# Altium footprint library ST封装.PcbLib: 1336 footprints (part 73 of 109)
Each footprint in its own frame and in the unit in brackets; x right, y up, seen from the top. Pads: shape width x height; smd on the part's side, far side on the other; paste and mask are expansions set on the pad; w line width, h text height; cw(c..) or ccw(c..) is an arc to the next point about the centre after c.
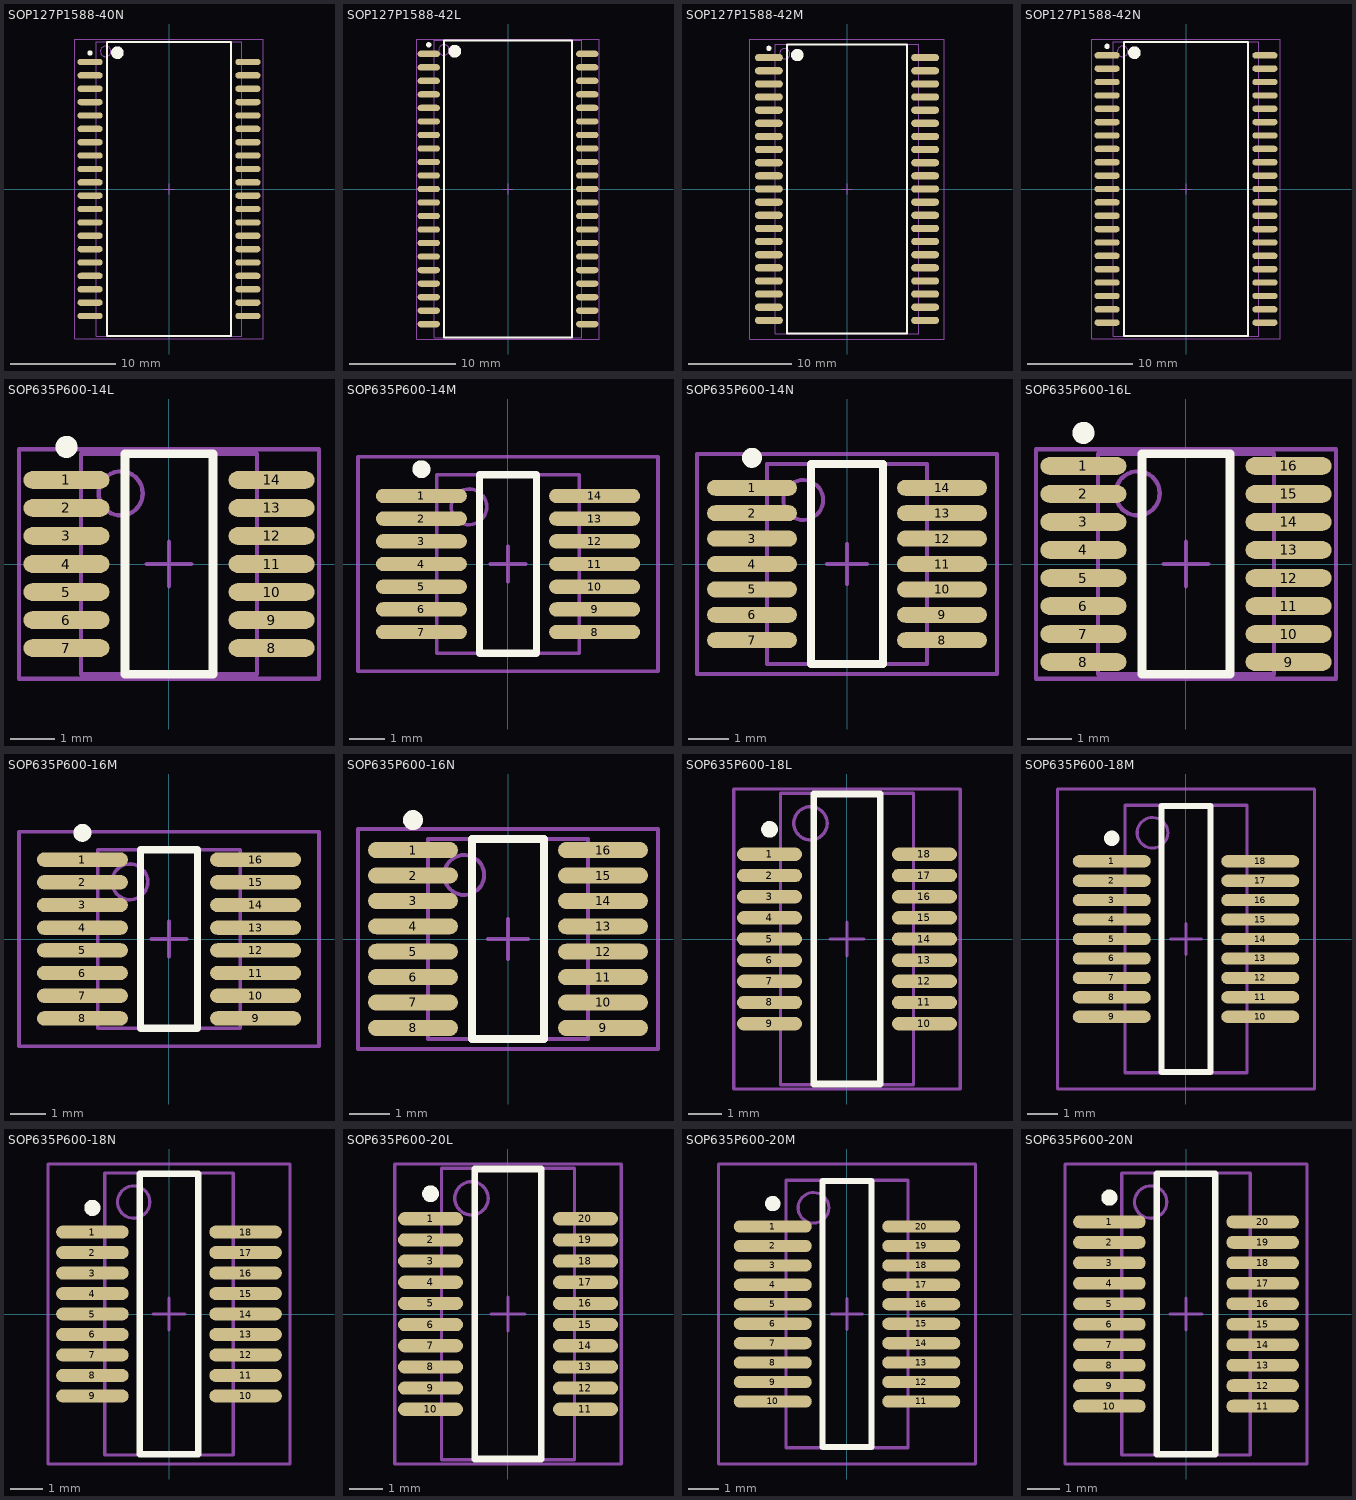
[diagram p72: the footprints below, top view; thin cyan lines are the x and y axes]

## SOP127P1588-40N [mm] "SOP, 40-Leads, Body 27x13.8mm, Pitch 1.27mm, IPC Medium Density"
height 4
pads (40):
  oval 2.4x0.6 smd: 1(-7.5,12.065) 2(-7.5,10.795) 3(-7.5,9.525) 4(-7.5,8.255) 5(-7.5,6.985) 6(-7.5,5.715) 7(-7.5,4.445) 8(-7.5,3.175) 9(-7.5,1.905) 10(-7.5,0.635) 11(-7.5,-0.635) 12(-7.5,-1.905) 13(-7.5,-3.175) 14(-7.5,-4.445) 15(-7.5,-5.715) 16(-7.5,-6.985) 17(-7.5,-8.255) 18(-7.5,-9.525) 19(-7.5,-10.795) 20(-7.5,-12.065) 21(7.5,-12.065) 22(7.5,-10.795) 23(7.5,-9.525) 24(7.5,-8.255) 25(7.5,-6.985) 26(7.5,-5.715) 27(7.5,-4.445) 28(7.5,-3.175) 29(7.5,-1.905) 30(7.5,-0.635) 31(7.5,0.635) 32(7.5,1.905) 33(7.5,3.175) 34(7.5,4.445) 35(7.5,5.715) 36(7.5,6.985) 37(7.5,8.255) 38(7.5,9.525) 39(7.5,10.795) 40(7.5,12.065)
Top Overlay:
  circle w0.6: c-4.9,12.95 r0.3
  circle w0.25: c-7.5,12.915 r0.125
  lines w0.2: -5.9,-13.95 5.9,-13.95 5.9,13.95 -5.9,13.95 -5.9,-13.95
Mechanical 13:
  circle w0.1: c-6.02,13.07 r0.5
  lines w0.1: -6.92,-13.97 6.92,-13.97 6.92,13.97 -6.92,13.97 -6.92,-13.97
Mechanical 15:
  lines w0.1: -0.5,0 0.5,0 ; 0,-0.5 0,0.5 ; -8.95,-14.25 8.95,-14.25 8.95,14.25 -8.95,14.25 -8.95,-14.25
3D body: height 4, standoff 0, extent -6.92,-13.97 6.92,13.97

## SOP127P1588-42L [mm] "SOP, 42-Leads, Body 27x13.8mm, Pitch 1.27mm, IPC High Density"
height 4
pads (42):
  oval 2.1x0.6 smd: 1(-7.45,12.7) 2(-7.45,11.43) 3(-7.45,10.16) 4(-7.45,8.89) 5(-7.45,7.62) 6(-7.45,6.35) 7(-7.45,5.08) 8(-7.45,3.81) 9(-7.45,2.54) 10(-7.45,1.27) 11(-7.45,0) 12(-7.45,-1.27) 13(-7.45,-2.54) 14(-7.45,-3.81) 15(-7.45,-5.08) 16(-7.45,-6.35) 17(-7.45,-7.62) 18(-7.45,-8.89) 19(-7.45,-10.16) 20(-7.45,-11.43) 21(-7.45,-12.7) 22(7.45,-12.7) 23(7.45,-11.43) 24(7.45,-10.16) 25(7.45,-8.89) 26(7.45,-7.62) 27(7.45,-6.35) 28(7.45,-5.08) 29(7.45,-3.81) 30(7.45,-2.54) 31(7.45,-1.27) 32(7.45,0) 33(7.45,1.27) 34(7.45,2.54) 35(7.45,3.81) 36(7.45,5.08) 37(7.45,6.35) 38(7.45,7.62) 39(7.45,8.89) 40(7.45,10.16) 41(7.45,11.43) 42(7.45,12.7)
Top Overlay:
  circle w0.25: c-7.45,13.55 r0.125
  circle w0.6: c-5,12.95 r0.3
  lines w0.2: -6,-13.95 -6,13.95 6,13.95 6,-13.95 -6,-13.95
Mechanical 13:
  circle w0.1: c-6.02,13.07 r0.5
  lines w0.1: -6.92,-13.97 -6.92,13.97 6.92,13.97 6.92,-13.97 -6.92,-13.97
Mechanical 15:
  lines w0.1: -0.5,0 0.5,0 ; 0,-0.5 0,0.5 ; -8.6,-14.1 -8.6,14.1 8.6,14.1 8.6,-14.1 -8.6,-14.1
3D body: height 4, standoff 0, extent -6.92,-13.97 6.92,13.97

## SOP127P1588-42M [mm] "SOP, 42-Leads, Body 27x13.8mm, Pitch 1.27mm, IPC Low Density"
height 4
pads (42):
  oval 2.7x0.7 smd: 1(-7.55,12.7) 2(-7.55,11.43) 3(-7.55,10.16) 4(-7.55,8.89) 5(-7.55,7.62) 6(-7.55,6.35) 7(-7.55,5.08) 8(-7.55,3.81) 9(-7.55,2.54) 10(-7.55,1.27) 11(-7.55,0) 12(-7.55,-1.27) 13(-7.55,-2.54) 14(-7.55,-3.81) 15(-7.55,-5.08) 16(-7.55,-6.35) 17(-7.55,-7.62) 18(-7.55,-8.89) 19(-7.55,-10.16) 20(-7.55,-11.43) 21(-7.55,-12.7) 22(7.55,-12.7) 23(7.55,-11.43) 24(7.55,-10.16) 25(7.55,-8.89) 26(7.55,-7.62) 27(7.55,-6.35) 28(7.55,-5.08) 29(7.55,-3.81) 30(7.55,-2.54) 31(7.55,-1.27) 32(7.55,0) 33(7.55,1.27) 34(7.55,2.54) 35(7.55,3.81) 36(7.55,5.08) 37(7.55,6.35) 38(7.55,7.62) 39(7.55,8.89) 40(7.55,10.16) 41(7.55,11.43) 42(7.55,12.7)
Top Overlay:
  circle w0.25: c-7.55,13.6 r0.125
  circle w0.6: c-4.8,12.95 r0.3
  lines w0.2: -5.8,-13.95 -5.8,13.95 5.8,13.95 5.8,-13.95 -5.8,-13.95
Mechanical 13:
  circle w0.1: c-6.02,13.07 r0.5
  lines w0.1: -6.92,-13.97 -6.92,13.97 6.92,13.97 6.92,-13.97 -6.92,-13.97
Mechanical 15:
  lines w0.1: -0.5,0 0.5,0 ; 0,-0.5 0,0.5 ; -9.4,-14.5 -9.4,14.5 9.4,14.5 9.4,-14.5 -9.4,-14.5
3D body: height 4, standoff 0, extent -6.92,-13.97 6.92,13.97

## SOP127P1588-42N [mm] "SOP, 42-Leads, Body 27x13.8mm, Pitch 1.27mm, IPC Medium Density"
height 4
pads (42):
  oval 2.4x0.6 smd: 1(-7.5,12.7) 2(-7.5,11.43) 3(-7.5,10.16) 4(-7.5,8.89) 5(-7.5,7.62) 6(-7.5,6.35) 7(-7.5,5.08) 8(-7.5,3.81) 9(-7.5,2.54) 10(-7.5,1.27) 11(-7.5,0) 12(-7.5,-1.27) 13(-7.5,-2.54) 14(-7.5,-3.81) 15(-7.5,-5.08) 16(-7.5,-6.35) 17(-7.5,-7.62) 18(-7.5,-8.89) 19(-7.5,-10.16) 20(-7.5,-11.43) 21(-7.5,-12.7) 22(7.5,-12.7) 23(7.5,-11.43) 24(7.5,-10.16) 25(7.5,-8.89) 26(7.5,-7.62) 27(7.5,-6.35) 28(7.5,-5.08) 29(7.5,-3.81) 30(7.5,-2.54) 31(7.5,-1.27) 32(7.5,0) 33(7.5,1.27) 34(7.5,2.54) 35(7.5,3.81) 36(7.5,5.08) 37(7.5,6.35) 38(7.5,7.62) 39(7.5,8.89) 40(7.5,10.16) 41(7.5,11.43) 42(7.5,12.7)
Top Overlay:
  circle w0.25: c-7.5,13.55 r0.125
  circle w0.6: c-4.9,12.95 r0.3
  lines w0.2: -5.9,-13.95 -5.9,13.95 5.9,13.95 5.9,-13.95 -5.9,-13.95
Mechanical 13:
  circle w0.1: c-6.02,13.07 r0.5
  lines w0.1: -6.92,-13.97 -6.92,13.97 6.92,13.97 6.92,-13.97 -6.92,-13.97
Mechanical 15:
  lines w0.1: -0.5,0 0.5,0 ; 0,-0.5 0,0.5 ; -8.95,-14.25 -8.95,14.25 8.95,14.25 8.95,-14.25 -8.95,-14.25
3D body: height 4, standoff 0, extent -6.92,-13.97 6.92,13.97

## SOP635P600-14L [mm] "SOP, 14-Leads, Body 4.9x3.9mm, Pitch 0.635mm, IPC High Density"
height 1.76
pads (14):
  oval 1.95x0.4 smd: 1(-2.325,1.905) 2(-2.325,1.27) 3(-2.325,0.635) 4(-2.325,0) 5(-2.325,-0.635) 6(-2.325,-1.27) 7(-2.325,-1.905) 8(2.325,-1.905) 9(2.325,-1.27) 10(2.325,-0.635) 11(2.325,0) 12(2.325,0.635) 13(2.325,1.27) 14(2.325,1.905)
Top Overlay:
  circle w0.25: c-2.325,2.655 r0.125
  lines w0.2: -1,-2.5 1,-2.5 1,2.5 -1,2.5 -1,-2.5
Mechanical 13:
  circle w0.1: c-1.095,1.6 r0.5
  lines w0.1: -1.995,-2.5 1.995,-2.5 1.995,2.5 -1.995,2.5 -1.995,-2.5
Mechanical 15:
  lines w0.1: -0.5,0 0.5,0 ; 0,-0.5 0,0.5 ; -3.4,-2.6 3.4,-2.6 3.4,2.6 -3.4,2.6 -3.4,-2.6
3D body: height 1.76, standoff 0, extent -1.995,-2.5 1.995,2.5

## SOP635P600-14M [mm] "SOP, 14-Leads, Body 4.9x3.9mm, Pitch 0.635mm, IPC Low Density"
height 1.76
pads (14):
  oval 2.55x0.4 smd: 1(-2.425,1.905) 2(-2.425,1.27) 3(-2.425,0.635) 4(-2.425,0) 5(-2.425,-0.635) 6(-2.425,-1.27) 7(-2.425,-1.905) 8(2.425,-1.905) 9(2.425,-1.27) 10(2.425,-0.635) 11(2.425,0) 12(2.425,0.635) 13(2.425,1.27) 14(2.425,1.905)
Top Overlay:
  circle w0.25: c-2.425,2.655 r0.125
  lines w0.2: -0.8,-2.5 -0.8,2.5 0.8,2.5 0.8,-2.5 -0.8,-2.5
Mechanical 13:
  circle w0.1: c-1.095,1.6 r0.5
  lines w0.1: -1.995,-2.5 -1.995,2.5 1.995,2.5 1.995,-2.5 -1.995,-2.5
Mechanical 15:
  lines w0.1: -0.5,0 0.5,0 ; 0,-0.5 0,0.5 ; -4.2,-3 -4.2,3 4.2,3 4.2,-3 -4.2,-3
3D body: height 1.76, standoff 0, extent -1.995,-2.5 1.995,2.5

## SOP635P600-14N [mm] "SOP, 14-Leads, Body 4.9x3.9mm, Pitch 0.635mm, IPC Medium Density"
height 1.76
pads (14):
  oval 2.25x0.4 smd: 1(-2.375,1.905) 2(-2.375,1.27) 3(-2.375,0.635) 4(-2.375,0) 5(-2.375,-0.635) 6(-2.375,-1.27) 7(-2.375,-1.905) 8(2.375,-1.905) 9(2.375,-1.27) 10(2.375,-0.635) 11(2.375,0) 12(2.375,0.635) 13(2.375,1.27) 14(2.375,1.905)
Top Overlay:
  circle w0.25: c-2.375,2.655 r0.125
  lines w0.2: -0.9,-2.5 -0.9,2.5 0.9,2.5 0.9,-2.5 -0.9,-2.5
Mechanical 13:
  circle w0.1: c-1.095,1.6 r0.5
  lines w0.1: -1.995,-2.5 -1.995,2.5 1.995,2.5 1.995,-2.5 -1.995,-2.5
Mechanical 15:
  lines w0.1: -0.5,0 0.5,0 ; 0,-0.5 0,0.5 ; -3.75,-2.75 -3.75,2.75 3.75,2.75 3.75,-2.75 -3.75,-2.75
3D body: height 1.76, standoff 0, extent -1.995,-2.5 1.995,2.5

## SOP635P600-16L [mm] "SOP, 16-Leads, Body 4.9x3.9mm, Pitch 0.635mm, IPC High Density"
height 1.76
pads (16):
  oval 1.95x0.4 smd: 1(-2.325,2.222) 2(-2.325,1.587) 3(-2.325,0.953) 4(-2.325,0.318) 5(-2.325,-0.318) 6(-2.325,-0.953) 7(-2.325,-1.587) 8(-2.325,-2.222) 9(2.325,-2.222) 10(2.325,-1.587) 11(2.325,-0.953) 12(2.325,-0.318) 13(2.325,0.318) 14(2.325,0.953) 15(2.325,1.587) 16(2.325,2.222)
Top Overlay:
  circle w0.25: c-2.325,2.973 r0.125
  lines w0.2: -1,-2.5 1,-2.5 1,2.5 -1,2.5 -1,-2.5
Mechanical 13:
  circle w0.1: c-1.095,1.6 r0.5
  lines w0.1: -1.995,-2.5 1.995,-2.5 1.995,2.5 -1.995,2.5 -1.995,-2.5
Mechanical 15:
  lines w0.1: -0.5,0 0.5,0 ; 0,-0.5 0,0.5 ; -3.4,-2.6 3.4,-2.6 3.4,2.6 -3.4,2.6 -3.4,-2.6
3D body: height 1.76, standoff 0, extent -1.995,-2.5 1.995,2.5

## SOP635P600-16M [mm] "SOP, 16-Leads, Body 4.9x3.9mm, Pitch 0.635mm, IPC Low Density"
height 1.76
pads (16):
  oval 2.55x0.4 smd: 1(-2.425,2.222) 2(-2.425,1.587) 3(-2.425,0.953) 4(-2.425,0.318) 5(-2.425,-0.318) 6(-2.425,-0.953) 7(-2.425,-1.587) 8(-2.425,-2.222) 9(2.425,-2.222) 10(2.425,-1.587) 11(2.425,-0.953) 12(2.425,-0.318) 13(2.425,0.318) 14(2.425,0.953) 15(2.425,1.587) 16(2.425,2.222)
Top Overlay:
  circle w0.25: c-2.425,2.973 r0.125
  lines w0.2: -0.8,-2.5 0.8,-2.5 0.8,2.5 -0.8,2.5 -0.8,-2.5
Mechanical 13:
  circle w0.1: c-1.095,1.6 r0.5
  lines w0.1: -1.995,-2.5 1.995,-2.5 1.995,2.5 -1.995,2.5 -1.995,-2.5
Mechanical 15:
  lines w0.1: -0.5,0 0.5,0 ; 0,-0.5 0,0.5 ; -4.2,-3 4.2,-3 4.2,3 -4.2,3 -4.2,-3
3D body: height 1.76, standoff 0, extent -1.995,-2.5 1.995,2.5

## SOP635P600-16N [mm] "SOP, 16-Leads, Body 4.9x3.9mm, Pitch 0.635mm, IPC Medium Density"
height 1.76
pads (16):
  oval 2.25x0.4 smd: 1(-2.375,2.222) 2(-2.375,1.587) 3(-2.375,0.953) 4(-2.375,0.318) 5(-2.375,-0.318) 6(-2.375,-0.953) 7(-2.375,-1.587) 8(-2.375,-2.222) 9(2.375,-2.222) 10(2.375,-1.587) 11(2.375,-0.953) 12(2.375,-0.318) 13(2.375,0.318) 14(2.375,0.953) 15(2.375,1.587) 16(2.375,2.222)
Top Overlay:
  circle w0.25: c-2.375,2.973 r0.125
  lines w0.2: -0.9,-2.5 0.9,-2.5 0.9,2.5 -0.9,2.5 -0.9,-2.5
Mechanical 13:
  circle w0.1: c-1.095,1.6 r0.5
  lines w0.1: -1.995,-2.5 1.995,-2.5 1.995,2.5 -1.995,2.5 -1.995,-2.5
Mechanical 15:
  lines w0.1: -0.5,0 0.5,0 ; 0,-0.5 0,0.5 ; -3.75,-2.75 3.75,-2.75 3.75,2.75 -3.75,2.75 -3.75,-2.75
3D body: height 1.76, standoff 0, extent -1.995,-2.5 1.995,2.5

## SOP635P600-18L [mm] "SOP, 18-Leads, Body 8.6x3.9mm, Pitch 0.635mm, IPC High Density"
height 1.76
pads (18):
  oval 1.95x0.4 smd: 1(-2.325,2.54) 2(-2.325,1.905) 3(-2.325,1.27) 4(-2.325,0.635) 5(-2.325,0) 6(-2.325,-0.635) 7(-2.325,-1.27) 8(-2.325,-1.905) 9(-2.325,-2.54) 10(2.325,-2.54) 11(2.325,-1.905) 12(2.325,-1.27) 13(2.325,-0.635) 14(2.325,0) 15(2.325,0.635) 16(2.325,1.27) 17(2.325,1.905) 18(2.325,2.54)
Top Overlay:
  circle w0.25: c-2.325,3.29 r0.125
  lines w0.2: -1,-4.35 1,-4.35 1,4.35 -1,4.35 -1,-4.35
Mechanical 13:
  circle w0.1: c-1.095,3.47 r0.5
  lines w0.1: -1.995,-4.37 1.995,-4.37 1.995,4.37 -1.995,4.37 -1.995,-4.37
Mechanical 15:
  lines w0.1: -0.5,0 0.5,0 ; 0,-0.5 0,0.5 ; -3.4,-4.5 3.4,-4.5 3.4,4.5 -3.4,4.5 -3.4,-4.5
3D body: height 1.76, standoff 0, extent -1.995,-4.37 1.995,4.37

## SOP635P600-18M [mm] "SOP, 18-Leads, Body 8.6x3.9mm, Pitch 0.635mm, IPC Low Density"
height 1.76
pads (18):
  oval 2.55x0.4 smd: 1(-2.425,2.54) 2(-2.425,1.905) 3(-2.425,1.27) 4(-2.425,0.635) 5(-2.425,0) 6(-2.425,-0.635) 7(-2.425,-1.27) 8(-2.425,-1.905) 9(-2.425,-2.54) 10(2.425,-2.54) 11(2.425,-1.905) 12(2.425,-1.27) 13(2.425,-0.635) 14(2.425,0) 15(2.425,0.635) 16(2.425,1.27) 17(2.425,1.905) 18(2.425,2.54)
Top Overlay:
  circle w0.25: c-2.425,3.29 r0.125
  lines w0.2: -0.8,-4.35 0.8,-4.35 0.8,4.35 -0.8,4.35 -0.8,-4.35
Mechanical 13:
  circle w0.1: c-1.095,3.47 r0.5
  lines w0.1: -1.995,-4.37 1.995,-4.37 1.995,4.37 -1.995,4.37 -1.995,-4.37
Mechanical 15:
  lines w0.1: -0.5,0 0.5,0 ; 0,-0.5 0,0.5 ; -4.2,-4.9 4.2,-4.9 4.2,4.9 -4.2,4.9 -4.2,-4.9
3D body: height 1.76, standoff 0, extent -1.995,-4.37 1.995,4.37

## SOP635P600-18N [mm] "SOP, 18-Leads, Body 8.6x3.9mm, Pitch 0.635mm, IPC Medium Density"
height 1.76
pads (18):
  oval 2.25x0.4 smd: 1(-2.375,2.54) 2(-2.375,1.905) 3(-2.375,1.27) 4(-2.375,0.635) 5(-2.375,0) 6(-2.375,-0.635) 7(-2.375,-1.27) 8(-2.375,-1.905) 9(-2.375,-2.54) 10(2.375,-2.54) 11(2.375,-1.905) 12(2.375,-1.27) 13(2.375,-0.635) 14(2.375,0) 15(2.375,0.635) 16(2.375,1.27) 17(2.375,1.905) 18(2.375,2.54)
Top Overlay:
  circle w0.25: c-2.375,3.29 r0.125
  lines w0.2: -0.9,-4.35 0.9,-4.35 0.9,4.35 -0.9,4.35 -0.9,-4.35
Mechanical 13:
  circle w0.1: c-1.095,3.47 r0.5
  lines w0.1: -1.995,-4.37 1.995,-4.37 1.995,4.37 -1.995,4.37 -1.995,-4.37
Mechanical 15:
  lines w0.1: -0.5,0 0.5,0 ; 0,-0.5 0,0.5 ; -3.75,-4.65 3.75,-4.65 3.75,4.65 -3.75,4.65 -3.75,-4.65
3D body: height 1.76, standoff 0, extent -1.995,-4.37 1.995,4.37

## SOP635P600-20L [mm] "SOP, 20-Leads, Body 8.6x3.9mm, Pitch 0.635mm, IPC High Density"
height 1.76
pads (20):
  oval 1.95x0.4 smd: 1(-2.325,2.857) 2(-2.325,2.222) 3(-2.325,1.587) 4(-2.325,0.953) 5(-2.325,0.318) 6(-2.325,-0.318) 7(-2.325,-0.953) 8(-2.325,-1.587) 9(-2.325,-2.222) 10(-2.325,-2.857) 11(2.325,-2.857) 12(2.325,-2.222) 13(2.325,-1.587) 14(2.325,-0.953) 15(2.325,-0.318) 16(2.325,0.318) 17(2.325,0.953) 18(2.325,1.587) 19(2.325,2.222) 20(2.325,2.857)
Top Overlay:
  circle w0.25: c-2.325,3.608 r0.125
  lines w0.2: -1,-4.35 1,-4.35 1,4.35 -1,4.35 -1,-4.35
Mechanical 13:
  circle w0.1: c-1.095,3.47 r0.5
  lines w0.1: -1.995,-4.37 1.995,-4.37 1.995,4.37 -1.995,4.37 -1.995,-4.37
Mechanical 15:
  lines w0.1: -0.5,0 0.5,0 ; 0,-0.5 0,0.5 ; -3.4,-4.5 3.4,-4.5 3.4,4.5 -3.4,4.5 -3.4,-4.5
3D body: height 1.76, standoff 0, extent -1.995,-4.37 1.995,4.37

## SOP635P600-20M [mm] "SOP, 20-Leads, Body 8.6x3.9mm, Pitch 0.635mm, IPC Low Density"
height 1.76
pads (20):
  oval 2.55x0.4 smd: 1(-2.425,2.857) 2(-2.425,2.222) 3(-2.425,1.587) 4(-2.425,0.953) 5(-2.425,0.318) 6(-2.425,-0.318) 7(-2.425,-0.953) 8(-2.425,-1.587) 9(-2.425,-2.222) 10(-2.425,-2.857) 11(2.425,-2.857) 12(2.425,-2.222) 13(2.425,-1.587) 14(2.425,-0.953) 15(2.425,-0.318) 16(2.425,0.318) 17(2.425,0.953) 18(2.425,1.587) 19(2.425,2.222) 20(2.425,2.857)
Top Overlay:
  circle w0.25: c-2.425,3.608 r0.125
  lines w0.2: -0.8,-4.35 0.8,-4.35 0.8,4.35 -0.8,4.35 -0.8,-4.35
Mechanical 13:
  circle w0.1: c-1.095,3.47 r0.5
  lines w0.1: -1.995,-4.37 1.995,-4.37 1.995,4.37 -1.995,4.37 -1.995,-4.37
Mechanical 15:
  lines w0.1: -0.5,0 0.5,0 ; 0,-0.5 0,0.5 ; -4.2,-4.9 4.2,-4.9 4.2,4.9 -4.2,4.9 -4.2,-4.9
3D body: height 1.76, standoff 0, extent -1.995,-4.37 1.995,4.37

## SOP635P600-20N [mm] "SOP, 20-Leads, Body 8.6x3.9mm, Pitch 0.635mm, IPC Medium Density"
height 1.76
pads (20):
  oval 2.25x0.4 smd: 1(-2.375,2.857) 2(-2.375,2.222) 3(-2.375,1.587) 4(-2.375,0.953) 5(-2.375,0.318) 6(-2.375,-0.318) 7(-2.375,-0.953) 8(-2.375,-1.587) 9(-2.375,-2.222) 10(-2.375,-2.857) 11(2.375,-2.857) 12(2.375,-2.222) 13(2.375,-1.587) 14(2.375,-0.953) 15(2.375,-0.318) 16(2.375,0.318) 17(2.375,0.953) 18(2.375,1.587) 19(2.375,2.222) 20(2.375,2.857)
Top Overlay:
  circle w0.25: c-2.375,3.608 r0.125
  lines w0.2: -0.9,-4.35 -0.9,4.35 0.9,4.35 0.9,-4.35 -0.9,-4.35
Mechanical 13:
  circle w0.1: c-1.095,3.47 r0.5
  lines w0.1: -1.995,-4.37 -1.995,4.37 1.995,4.37 1.995,-4.37 -1.995,-4.37
Mechanical 15:
  lines w0.1: -0.5,0 0.5,0 ; 0,-0.5 0,0.5 ; -3.75,-4.65 -3.75,4.65 3.75,4.65 3.75,-4.65 -3.75,-4.65
3D body: height 1.76, standoff 0, extent -1.995,-4.37 1.995,4.37